# Altium footprint library MCU.PcbLib: 87 footprints (part 6 of 6)
Each footprint in its own frame and in the unit in brackets; x right, y up, seen from the top. Pads: shape width x height; smd on the part's side, far side on the other; paste and mask are expansions set on the pad; w line width, h text height; cw(c..) or ccw(c..) is an arc to the next point about the centre after c.
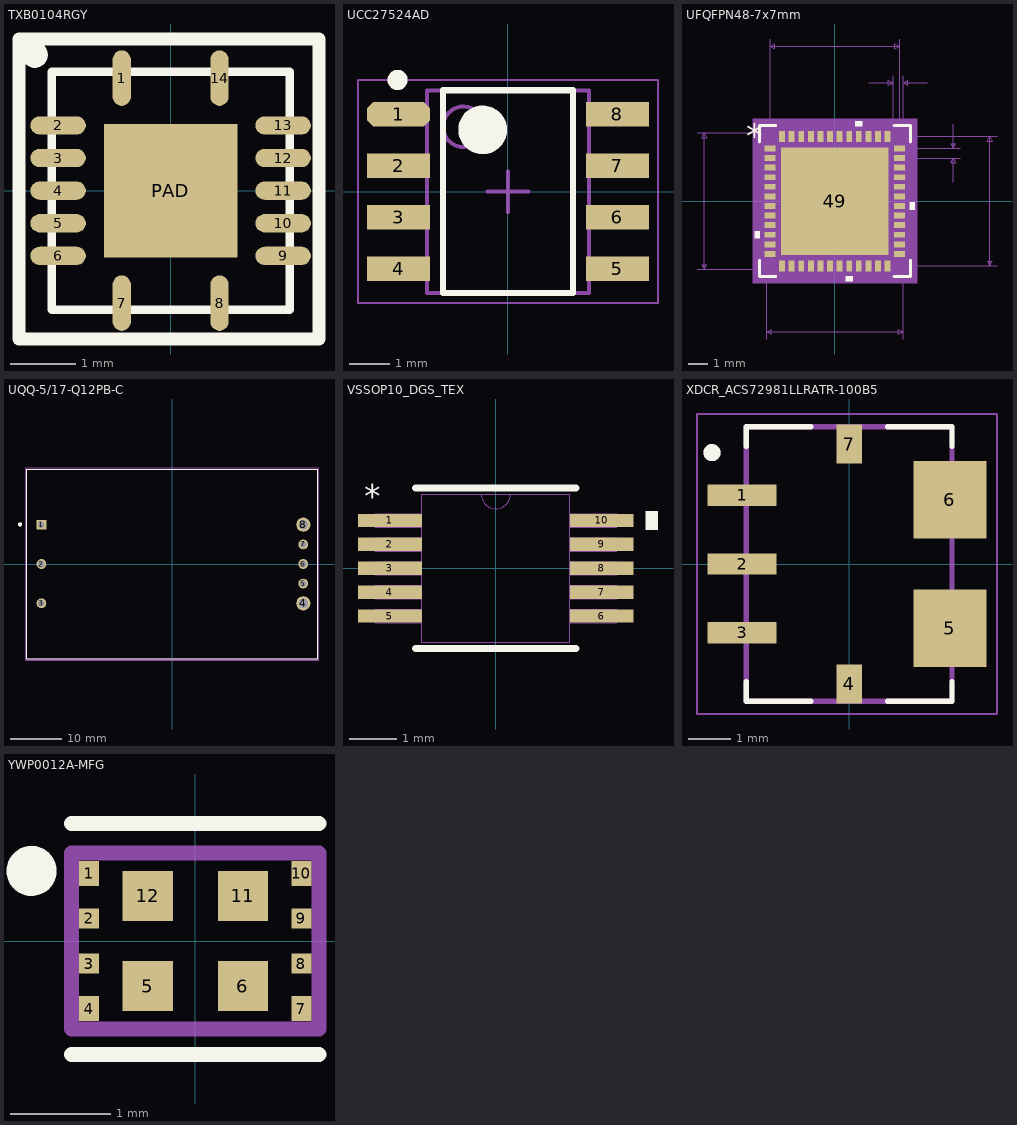
[diagram p5: the footprints below, top view; thin cyan lines are the x and y axes]

## TXB0104RGY [mm]
pads (15):
  oval 0.28x0.85 smd: 1(-0.75,1.725) 7(-0.75,-1.725) 8(0.75,-1.725) 14(0.75,1.725)
  oval 0.85x0.28 smd: 2(-1.725,1) 3(-1.725,0.5) 4(-1.725,0) 5(-1.725,-0.5) 6(-1.725,-1) 9(1.725,-1) 10(1.725,-0.5) 11(1.725,0) 12(1.725,0.5) 13(1.725,1)
  rect 2.05x2.05 smd: PAD(0,0)
Top Overlay:
  circle w0.2: c-2.083,2.083 r0.1
  lines w0.127: -1.825,-1.825 1.825,-1.825 1.825,1.825 -1.825,1.825 -1.825,-1.825
  lines w0.2: -2.325,-2.275 2.275,-2.275 2.275,2.325 -2.325,2.325 -2.325,-2.275
3D body: height 0.75, standoff 0, extent -1.8,-1.8 1.8,1.8

## UCC27524AD [mm]
pads (8):
  oct 1.55x0.6 smd: 1(-2.7,1.905)
  rect 1.55x0.6 smd: 2(-2.7,0.635) 3(-2.7,-0.635) 4(-2.7,-1.905) 5(2.7,-1.905) 6(2.7,-0.635) 7(2.7,0.635) 8(2.7,1.905)
Top Overlay:
  circle w0.25: c-2.725,2.755 r0.125
  circle w0.6: c-0.625,1.525 r0.3
  lines w0.15: -1.6,-2.5 -1.6,2.5 1.6,2.5 1.6,-2.5 -1.6,-2.5
Mechanical 15:
  lines w0.05: -3.7,-2.75 -3.7,2.75 3.7,2.75 3.7,-2.75 -3.7,-2.75
  lines w0.1: -0.5,0 0.5,0 ; 0,-0.5 0,0.5
Mechanical 17:
  circle w0.1: c-1.1,1.6 r0.5
  lines w0.1: -2,-2.5 -2,2.5 2,2.5 2,-2.5 -2,-2.5
  text ".Designator" at -1.27,-1.27 h1.2
3D body "SOIC127P600-8N2.step": height 1.75, standoff 0, extent -3,-2.5 3,2.5

## UFQFPN48-7x7mm [mil]
pads (49):
  rect 22x12 smd: 1(-132.87,108.3) 2(-132.87,88.61) 3(-132.87,68.92) 4(-132.87,49.23) 5(-132.87,29.54) 6(-132.87,9.85) 7(-132.87,-9.85) 8(-132.87,-29.54) 9(-132.87,-49.23) 10(-132.87,-68.92) 11(-132.87,-88.61) 12(-132.87,-108.3) 25(132.87,-108.3) 26(132.87,-88.61) 27(132.87,-68.92) 28(132.87,-49.23) 29(132.87,-29.54) 30(132.87,-9.85) 31(132.87,9.85) 32(132.87,29.54) 33(132.87,49.23) 34(132.87,68.92) 35(132.87,88.61) 36(132.87,108.3)
  rect 12x22 smd: 13(-108.3,-132.87) 14(-88.61,-132.87) 15(-68.92,-132.87) 16(-49.23,-132.87) 17(-29.54,-132.87) 18(-9.85,-132.87) 19(9.85,-132.87) 20(29.54,-132.87) 21(49.23,-132.87) 22(68.92,-132.87) 23(88.61,-132.87) 24(108.3,-132.87) 37(108.3,132.87) 38(88.61,132.87) 39(68.92,132.87) 40(49.23,132.87) 41(29.54,132.87) 42(9.85,132.87) 43(-9.85,132.87) 44(-29.54,132.87) 45(-49.23,132.87) 46(-68.92,132.87) 47(-88.61,132.87) 48(-108.3,132.87)
  rect 220x220 smd paste-110: 49(0,0)
Top Overlay:
  region: -153.87,-61.41 -163.87,-61.41 -163.87,-76.42 -153.87,-76.42
  region: 37.03,-153.87 22.04,-153.87 22.04,-163.87 37.03,-163.87
  region: 153.87,-2.35 163.87,-2.35 163.87,-17.34 153.87,-17.34
  region: 56.73,153.87 41.73,153.87 41.73,163.87 56.73,163.87
  lines w6: -155,-121.21 -155,-155 -121.21,-155 ; -155,121.21 -155,155 -121.21,155 ; 121.21,-155 155,-155 155,-121.21 ; 121.21,155 155,155 155,121.21
  text "*" at -181.37,108.14 h50
Top Paste:
  drawing of 64 lines, arcs and shapes, not listed
Top Solder:
  drawing of 48 lines, arcs and shapes, not listed
Mechanical 5:
  region: 168.87,-168.87 -168.87,-168.87 -168.87,168.87 168.87,168.87
Mechanical 7:
  lines w1: -282.87,-140 140,-140 ; -282.87,140 140,140 140,-282.87 ; -140,-282.87 -140,140 ; -132.87,108.3 -132.87,332.87 ; 70,242.87 120,242.87 ; 108.3,-132.87 332.87,-132.87 ; 108.3,132.87 332.87,132.87 ; 120,108.3 120,257.87 ; 132.87,88.61 257.87,88.61 ; 132.87,332.87 132.87,108.3 257.87,108.3 ; 140,108.3 140,257.87 ; 190,242.87 140,242.87 ; 242.87,38.6 242.87,88.61 ; 242.87,158.29 242.87,108.3 ; -267.87,-140 -267.87,140 ; -267.87,-140 -272.87,-130 -262.87,-130 -267.87,-140 ; -267.87,140 -272.87,130 -262.87,130 -267.87,140 ; -140,-267.87 140,-267.87 ; -140,-267.87 -130,-262.87 -130,-272.87 -140,-267.87 ; -132.87,317.87 132.87,317.87 ; -132.87,317.87 -122.87,322.87 -122.87,312.87 -132.87,317.87 ; 120,242.87 110,247.87 110,237.87 120,242.87 ; 132.87,317.87 122.87,322.87 122.87,312.87 132.87,317.87 ; 140,-267.87 130,-262.87 130,-272.87 140,-267.87 ; 140,242.87 150,247.87 150,237.87 140,242.87 ; 242.87,88.61 237.87,78.61 247.87,78.61 242.87,88.61 ; 242.87,108.3 237.87,118.3 247.87,118.3 242.87,108.3 ; 317.87,-132.87 317.87,132.87 ; 317.87,-132.87 312.87,-122.87 322.87,-122.87 317.87,-132.87 ; 317.87,132.87 312.87,122.87 322.87,122.87 317.87,132.87
  text "Default Padstyle: RX12Y22D0T" at -350,-392.87 h50
  text "Heat Tab Padstyle: RX220Y220D0T" at -387.5,-452.87 h50
  text "Alt 1 Padstyle: OX60Y90D30P" at -337.5,-572.87 h50
  text "Alt 2 Padstyle: OX90Y60D30P" at -337.5,-632.87 h50
  text "0.02in/0.5mm" at 262.87,85.95 h25
  text "0.02in/0.508mm" at 42.5,262.87 h25
  text "0.266in/6.75mm" at -87.5,337.87 h25
  text "0.266in/6.75mm" at 337.87,-12.5 h25
  text "0.28in/7.112mm" at -462.87,-12.5 h25
  text "0.28in/7.112mm" at -87.5,-312.87 h25
Mechanical 13:
  lines w1: -140,90 -90,140 ; -140,-140 140,-140 140,140 -140,140 -140,-140 ; -140,-114.3 -140,-102.3 -140,-114.3 ; -140,-94.61 -140,-82.61 -140,-94.61 ; -140,-74.92 -140,-62.91 -140,-74.92 ; -140,-55.23 -140,-43.23 -140,-55.23 ; -140,-35.53 -140,-23.54 -140,-35.53 ; -140,-15.85 -140,-3.85 -140,-15.85 ; -140,3.85 -140,15.85 -140,3.85 ; -140,23.54 -140,35.53 -140,23.54 ; -140,43.23 -140,55.23 -140,43.23 ; -140,62.91 -140,74.92 -140,62.91 ; -140,82.61 -140,94.61 -140,82.61 ; -140,102.3 -140,114.3 -140,102.3 ; -114.3,-140 -102.3,-140 -114.3,-140 ; -114.3,140 -102.3,140 -114.3,140 ; -94.61,-140 -82.61,-140 -94.61,-140 ; -94.61,140 -82.61,140 -94.61,140 ; -74.92,-140 -62.91,-140 -74.92,-140 ; -74.92,140 -62.91,140 -74.92,140 ; -55.23,-140 -43.23,-140 -55.23,-140 ; -55.23,140 -43.23,140 -55.23,140 ; -35.53,-140 -23.54,-140 -35.53,-140 ; -35.53,140 -23.54,140 -35.53,140 ; -15.85,-140 -3.85,-140 -15.85,-140 ; -15.85,140 -3.85,140 -15.85,140 ; 3.85,-140 15.85,-140 3.85,-140 ; 3.85,140 15.85,140 3.85,140 ; 23.54,-140 35.53,-140 23.54,-140 ; 23.54,140 35.53,140 23.54,140 ; 43.23,-140 55.23,-140 43.23,-140 ; 43.23,140 55.23,140 43.23,140 ; 62.91,-140 74.92,-140 62.91,-140 ; 62.91,140 74.92,140 62.91,140 ; 82.61,-140 94.61,-140 82.61,-140 ; 82.61,140 94.61,140 82.61,140 ; 102.3,-140 114.3,-140 102.3,-140 ; 102.3,140 114.3,140 102.3,140 ; 140,-114.3 140,-102.3 140,-114.3 ; 140,-94.61 140,-82.61 140,-94.61 ; 140,-74.92 140,-62.91 140,-74.92 ; 140,-55.23 140,-43.23 140,-55.23 ; 140,-35.53 140,-23.54 140,-35.53 ; 140,-15.85 140,-3.85 140,-15.85 ; 140,3.85 140,15.85 140,3.85 ; 140,23.54 140,35.53 140,23.54 ; 140,43.23 140,55.23 140,43.23 ; 140,62.91 140,74.92 140,62.91 ; 140,82.61 140,94.61 140,82.61 ; 140,102.3 140,114.3 140,102.3
  text "*" at -124.37,93.14 h50
Mechanical 15:
  region: -128.29,-150 -150,-150 -150,-128.29 -148.87,-128.29 -148.87,128.29 -150,128.29 -150,150 -128.29,150 -128.29,148.87 128.29,148.87 128.29,150 150,150 150,128.29 148.87,128.29 148.87,-128.29 150,-128.29 150,-150 128.29,-150 128.29,-148.87 -128.29,-148.87
  lines w6: -150,-150 -150,-128.29 -148.87,-128.29 -148.87,128.29 -150,128.29 -150,150 -128.29,150 -128.29,148.87 128.29,148.87 128.29,150 150,150 150,128.29 148.87,128.29 148.87,-128.29 150,-128.29 150,-150 128.29,-150 128.29,-148.87 -128.29,-148.87 -128.29,-150 -150,-150
3D body: height 10, standoff 0, extent 0,0 10,10
3D body "User Library-QFN48-2.step": height 35.43, standoff 0, extent -138.78,-138.78 138.78,138.78

## UQQ-5/17-Q12PB-C [mm] "UQQ series Isolated supply"
pads (8):
  rect 1.91x1.91 hole 1.27: 1(-25.4,7.62)
  round 1.91 hole 1.27: 2(-25.4,0) 3(-25.4,-7.62) 5(25.4,-3.81) 6(25.4,0) 7(25.4,3.81)
  round 2.73 hole 1.82: 4(25.4,-7.62) 8(25.4,7.62)
Top Overlay:
  circle w0.4: c-29.538,7.673 r0.2
  lines w0.127: -28.2,-18.4 -28.2,18.4 28.2,18.4 28.2,-18.4 -28.2,-18.4
Mechanical 13:
  circle w0.4: c-29.538,7.673 r0.2
  lines w0.127: -28.2,-18.4 28.2,-18.4 28.2,18.4 -28.2,18.4 -28.2,-18.4
Mechanical 15:
  lines w0.05: -28.45,-18.65 28.45,-18.65 28.45,18.65 -28.45,18.65 -28.45,-18.65
3D body "mps_dcdc_uqq_3.3_25_q12_bp_a.step": height 12.85, standoff -4.85, extent -28.229,-18.434 28.159,18.423

## VSSOP10_DGS_TEX [mil]
pads (10):
  rect 52.5x11 smd paste+0 mask+0: 1(-87.25,39.37) 2(-87.25,19.68) 3(-87.25,0) 4(-87.25,-19.68) 5(-87.25,-39.37) 6(87.25,-39.37) 7(87.25,-19.68) 8(87.25,0) 9(87.25,19.68) 10(87.25,39.37)
Top Overlay:
  region: 123.5,46.87 133.5,46.87 133.5,31.87 123.5,31.87
  lines w6: -66,-66 66,-66 ; -66,66 66,66
  text "*" at -108.27,49.21 h19.68
Mechanical 13:
  lines w0: -12,61 ccw(c0,61) 12,61
  lines w1: -99.5,-44.87 -99.5,-33.87 -61,-33.87 -61,-44.87 -99.5,-44.87 ; -99.5,-25.18 -99.5,-14.19 -61,-14.19 -61,-25.18 -99.5,-25.18 ; -99.5,-5.5 -99.5,5.5 -61,5.5 -61,-5.5 -99.5,-5.5 ; -99.5,14.19 -99.5,25.18 -61,25.18 -61,14.19 -99.5,14.19 ; -99.5,33.87 -99.5,44.87 -61,44.87 -61,33.87 -99.5,33.87 ; -61,-61 61,-61 61,61 -61,61 -61,-61 ; 61,-44.87 61,-33.87 99.5,-33.87 99.5,-44.87 61,-44.87 ; 61,-25.18 61,-14.19 99.5,-14.19 99.5,-25.18 61,-25.18 ; 61,-5.5 61,5.5 99.5,5.5 99.5,-5.5 61,-5.5 ; 61,14.19 61,25.18 99.5,25.18 99.5,14.19 61,14.19 ; 61,33.87 61,44.87 99.5,44.87 99.5,33.87 61,33.87
  text "*" at -58.5,8 h50
3D body "VSSOP10_DGS_TEX.step": height 43.11, standoff 0, extent -99.49,-60.98 99.49,60.98

## XDCR_ACS72981LLRATR-100B5 [mm]
pads (7):
  rect 1.6x0.5 smd: 1(-2.5,1.6) 2(-2.5,0) 3(-2.5,-1.6)
  rect 0.6x0.9 smd: 4(0,-2.8) 7(0,2.8)
  rect 1.7x1.8 smd: 5(2.35,-1.5) 6(2.35,1.5)
Top Overlay:
  circle w0.2: c-3.2,2.6 r0.1
  lines w0.127: -2.4,-2.75 -2.4,-3.2 -0.9,-3.2 ; -2.4,2.75 -2.4,3.2 -0.9,3.2 ; 0.9,-3.2 2.4,-3.2 2.4,-2.75 ; 0.9,3.2 2.4,3.2 2.4,2.75
Mechanical 13:
  circle w0.2: c-3.2,2.6 r0.1
  lines w0.127: -2.4,-3.2 -2.4,3.2 2.4,3.2 2.4,-3.2 -2.4,-3.2
Mechanical 15:
  lines w0.05: -3.55,-3.5 -3.55,3.5 3.45,3.5 3.45,-3.5 -3.55,-3.5
3D body "ACS72981LLRATR-100B5.STEP": height 1.6, standoff 0, extent -3.3,-3.2 3.2,3.2

## YWP0012A-MFG [mm]
pads (12):
  rect 0.2x0.25 smd paste+0 mask+0: 1(-1.06,0.675) 4(-1.06,-0.675) 7(1.06,-0.675) 10(1.06,0.675)
  rect 0.2x0.2 smd paste+0 mask+0: 2(-1.06,0.225) 3(-1.06,-0.225) 8(1.06,-0.225) 9(1.06,0.225)
  rect 0.5x0.5 smd paste+0 mask+0: 5(-0.475,-0.45) 6(0.475,-0.45) 11(0.475,0.45) 12(-0.475,0.45)
Top Overlay:
  circle w0.25: c-1.636,0.7 r0.125
  lines w0.15: -1.235,-1.135 1.235,-1.135 ; -1.235,1.175 1.235,1.175
  text ".Designator" at -2.25,1.5 h0.5
Mechanical 13:
  lines w0.15: -1.235,-0.879 -1.235,0.879 1.235,0.879 1.235,-0.879 -1.235,-0.879